# Altium footprint library ThroHoleCap.PcbLib: 81 footprints (part 4 of 6)
Each footprint in its own frame and in the unit in brackets; x right, y up, seen from the top. Pads: shape width x height; smd on the part's side, far side on the other; paste and mask are expansions set on the pad; w line width, h text height; cw(c..) or ccw(c..) is an arc to the next point about the centre after c.
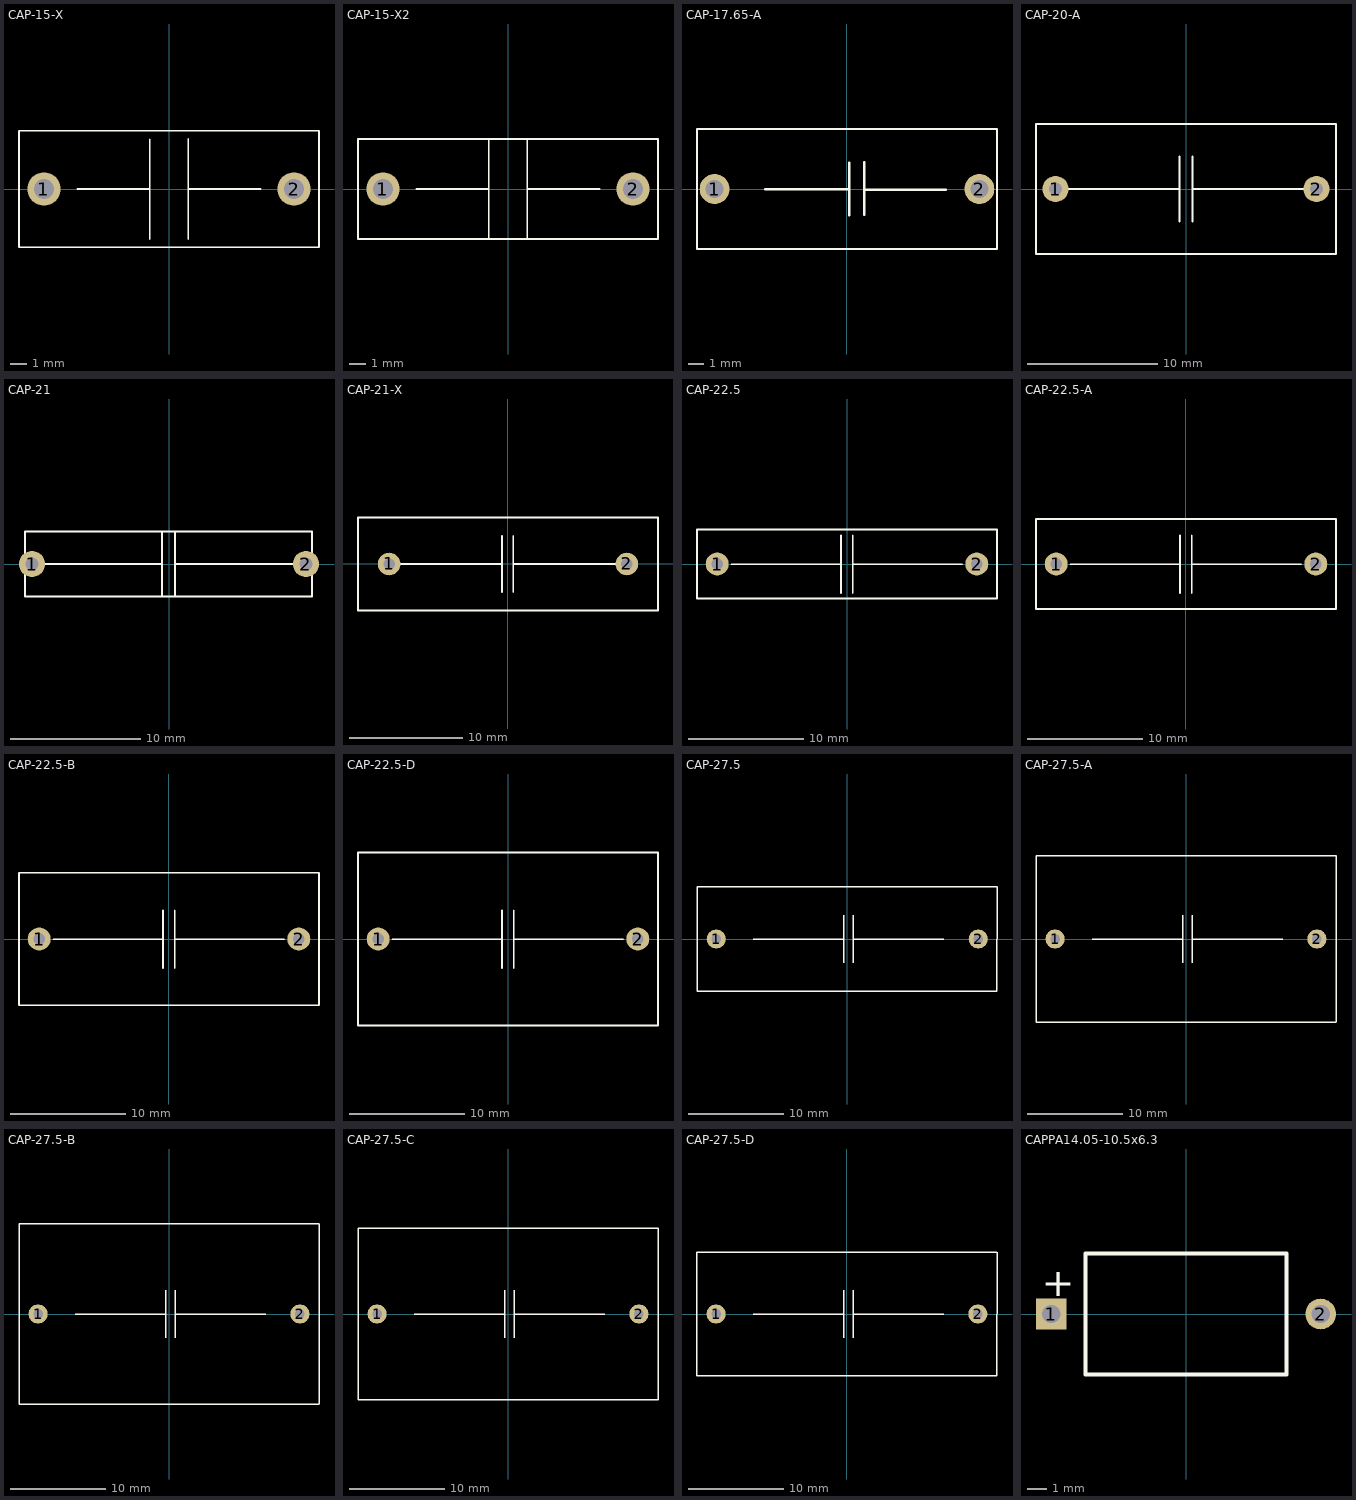
[diagram p3: the footprints below, top view; thin cyan lines are the x and y axes]

## CAP-15-X [mm]
pads (2):
  round 2 hole 1.2: 1(-7.5,0) 2(7.5,0)
Top Overlay:
  lines w0.1: -5.5,0 -1.15,0 ; -1.15,-3 -1.15,2.977 ; 1.15,-3 1.15,3 ; 1.15,0 5.5,0 ; -9,-3.5 -9,3.5 9,3.5 9,-3.5 -9,-3.5
3D body "User Library-MKT(15_17x18x7).step": height 13.5, standoff -2, extent -9,-3.505 9,3.505

## CAP-15-X2 [mm]
pads (2):
  round 2 hole 1.2: 1(-7.5,0) 2(7.5,0)
Top Overlay:
  lines w0.1: -5.5,0 -1.15,0 ; -1.173,3 -1.15,2.977 -1.15,-3 ; 1.15,-3 1.15,3 ; 1.15,0 5.5,0 ; -9,-3 9,-3 9,3 -9,3 -9,-3
3D body "User Library-WIMA Capacitor.step": height 12, standoff -2.5, extent -9,-3 9,3

## CAP-17.65-A [mm]
pads (2):
  round 2 hole 1.2: 1(-8.825,0) 2(8.825,0)
Top Overlay:
  lines w0.15: -5.445,-0.013 -1.443,-0.013 0.135,-0.013 ; 0.15,-1.752 0.15,1.769 ; 1.144,-1.722 1.144,1.798 ; 1.217,-0.043 6.594,-0.043 ; -10,-4 -10,4 10,4 10,-4 -10,-4
3D body "User Library-K73-17(20_8_17).step": height 16, standoff -1.5, extent -10,-4 10,4

## CAP-20-A [mm]
pads (2):
  round 2 hole 1: 1(-10,0) 2(10,0)
Top Overlay:
  lines w0.15: -10,0 -0.5,0 ; -0.5,-2.5 -0.5,2.5 ; 0.5,-2.5 0.5,2.5 ; 0.5,0 10,0 ; -11.5,-5 11.5,-5 11.5,5 -11.5,5 -11.5,-5
3D body "User Library-K73-17(23_10_20).step": height 22, standoff -2, extent -11.501,-5 11.499,5

## CAP-21 [mm]
pads (2):
  round 2 hole 1: 1(-10.5,0) 2(10.5,0)
Top Overlay:
  lines w0.15: -10.023,0.002 -0.523,0.002 ; -0.523,-2.498 -0.523,2.502 ; 0.477,-2.498 0.477,2.502 ; 0.477,0.002 9.977,0.002 ; -11.024,-2.498 -11.024,2.502 10.976,2.502 10.976,-2.498 -11.024,-2.498
3D body "CAP-21.STEP": height 13, standoff -4, extent -11.024,-2.498 10.976,2.502

## CAP-21-X [mm]
pads (2):
  round 2 hole 1: 1(-10.5,0) 2(10.5,0)
Top Overlay:
  lines w0.15: -10.023,0.002 -0.523,0.002 ; -0.523,-2.498 -0.523,2.502 ; 0.477,-2.498 0.477,2.502 ; 0.477,0.002 9.977,0.002 ; -13.249,-4.1 13.251,-4.1 13.251,4.1 -13.249,4.1 -13.249,-4.1
3D body "CAP-21-X2.STEP": height 17, standoff -1.5, extent -13.249,-4.1 13.251,4.1

## CAP-22.5 [mm]
pads (2):
  round 2 hole 1: 1(-11.25,0) 2(11.25,0)
Top Overlay:
  lines w0.15: -10.013,-0.023 -0.513,-0.023 ; -0.513,-2.523 -0.513,2.477 ; 0.487,-2.523 0.487,2.477 ; 0.487,-0.023 9.987,-0.023 ; -13,-3 -13,3 13,3 13,-3 -13,-3
3D body "MKT(22_5_26x15x6).step": height 16, standoff -2, extent -13,-3.005 13,3.005

## CAP-22.5-A [mm]
pads (2):
  round 2 hole 1: 1(-11.25,0) 2(11.25,0)
Top Overlay:
  lines w0.15: -10.013,-0.023 -0.513,-0.023 ; -0.513,-2.523 -0.513,2.477 ; 0.487,-2.523 0.487,2.477 ; 0.487,-0.023 9.987,-0.023 ; -13,-3.9 -13,3.9 13,3.9 13,-3.9 -13,-3.9
3D body "User Library-ECQE(F) 0_33uf 630Vdc 250Vac.step": height 18, standoff -4, extent -13,-3.9 13,3.9

## CAP-22.5-B [mm]
pads (2):
  round 2 hole 1: 1(-11.25,0) 2(11.25,0)
Top Overlay:
  lines w0.15: -10.013,-0.023 -0.513,-0.023 ; -0.513,-2.523 -0.513,2.477 ; 0.487,-2.523 0.487,2.477 ; 0.487,-0.023 9.987,-0.023 ; -13,-5.75 -13,5.75 13,5.75 13,-5.75 -13,-5.75
3D body "User Library-ECQE(F) 0_68uf 630Vdc 250Vac.step": height 22, standoff -4, extent -13,-5.75 13,5.75

## CAP-22.5-D [mm]
pads (2):
  round 2 hole 1: 1(-11.25,0) 2(11.25,0)
Top Overlay:
  lines w0.15: -10.013,-0.023 -0.513,-0.023 ; -0.513,-2.523 -0.513,2.477 ; 0.487,-2.523 0.487,2.477 ; 0.487,-0.023 9.987,-0.023 ; -13,-7.5 -13,7.5 13,7.5 13,-7.5 -13,-7.5
3D body "User Library-ECQE(F) 1_5uf 630Vdc 250Vac.step": height 25.7, standoff -4, extent -13,-7.65 13,7.65

## CAP-27.5 [mm]
pads (2):
  round 2 hole 1: 1(-13.75,0) 2(13.75,0)
Top Overlay:
  lines w0.15: -9.849,0 -0.349,0 ; -0.349,-2.5 -0.349,2.5 ; 0.651,-2.5 0.651,2.5 ; 0.651,0 10.151,0 ; -15.773,-5.5 15.714,-5.5 15.718,5.5 -15.761,5.5 -15.773,-5.5
3D body "User Library-B32924E3225M.step": height 21, standoff -1.5, extent -15.771,-5.5 15.729,5.5

## CAP-27.5-A [mm]
pads (2):
  round 2 hole 1: 1(-13.75,0) 2(13.75,0)
Top Overlay:
  lines w0.15: -9.849,0 -0.349,0 ; -0.349,-2.5 -0.349,2.5 ; 0.651,-2.5 0.651,2.5 ; 0.651,0 10.151,0 ; 15.737,-8.75 -15.75,-8.75 -15.75,8.75 15.75,8.75 15.75,-8.75
3D body "User Library-WIMA Capacitor.step": height 29, standoff -2.5, extent -15.757,-8.5 15.743,8.5

## CAP-27.5-B [mm]
pads (2):
  round 2 hole 1: 1(-13.75,0) 2(13.75,0)
Top Overlay:
  lines w0.15: -9.849,0 -0.349,0 ; -0.349,-2.5 -0.349,2.5 ; 0.651,-2.5 0.651,2.5 ; 0.651,0 10.151,0 ; 15.737,-9.5 -15.75,-9.5 -15.75,9.5 15.75,9.5 15.75,-9.5
3D body "User Library-B81131(19_30_31).step": height 30, standoff -1.5, extent -15.75,-9.5 15.75,9.5

## CAP-27.5-C [mm]
pads (2):
  round 2 hole 1: 1(-13.75,0) 2(13.75,0)
Top Overlay:
  lines w0.15: -9.849,0 -0.349,0 ; -0.349,-2.5 -0.349,2.5 ; 0.651,-2.5 0.651,2.5 ; 0.651,0 10.151,0 ; -15.75,-9 -15.75,9 15.75,9 15.75,-9 -15.75,-9
3D body "User Library-B32924F3565.step": height 1.5, standoff -33, extent -15.75,-9 15.75,9

## CAP-27.5-D [mm]
pads (2):
  round 2 hole 1: 1(-13.75,0) 2(13.75,0)
Top Overlay:
  lines w0.15: -9.849,0 -0.349,0 ; -0.349,-2.5 -0.349,2.5 ; 0.651,-2.5 0.651,2.5 ; 0.651,0 10.151,0 ; 15.75,6.5 -15.75,6.5 -15.75,-6.5 15.75,-6.5 15.755,6.5
3D body "CAP-27.5.STEP": height 1.05, standoff -22.45, extent -15.75,-6.5 15.75,6.5

## CAPPA14.05-10.5x6.3 [mm] "Capacitor, Axial, Polarised; Body 10.5 x 6.3 mm (LxDia. max), Lead Dia. 0.6 mm (typ)"
height 5.08
pads (2):
  rect 1.6x1.6 hole 0.95: 1(-7.025,0)
  round 1.6 hole 0.95: 2(7.025,0)
Top Overlay:
  lines w0.2: -5.25,-3.15 5.25,-3.15 5.25,3.15 -5.25,3.15 -5.25,-3.15
  text "+" at -7.525,0.925 h1.5
3D body "CAPPA14.05.STEP": height 6, standoff -0.5, extent -7.379,-2.997 7.341,3.013